# Altium footprint library RX8 GPS engine.PcbLib: 24 footprints (part 1 of 2)
Each footprint in its own frame and in the unit in brackets; x right, y up, seen from the top. Pads: shape width x height; smd on the part's side, far side on the other; paste and mask are expansions set on the pad; w line width, h text height; cw(c..) or ccw(c..) is an arc to the next point about the centre after c.
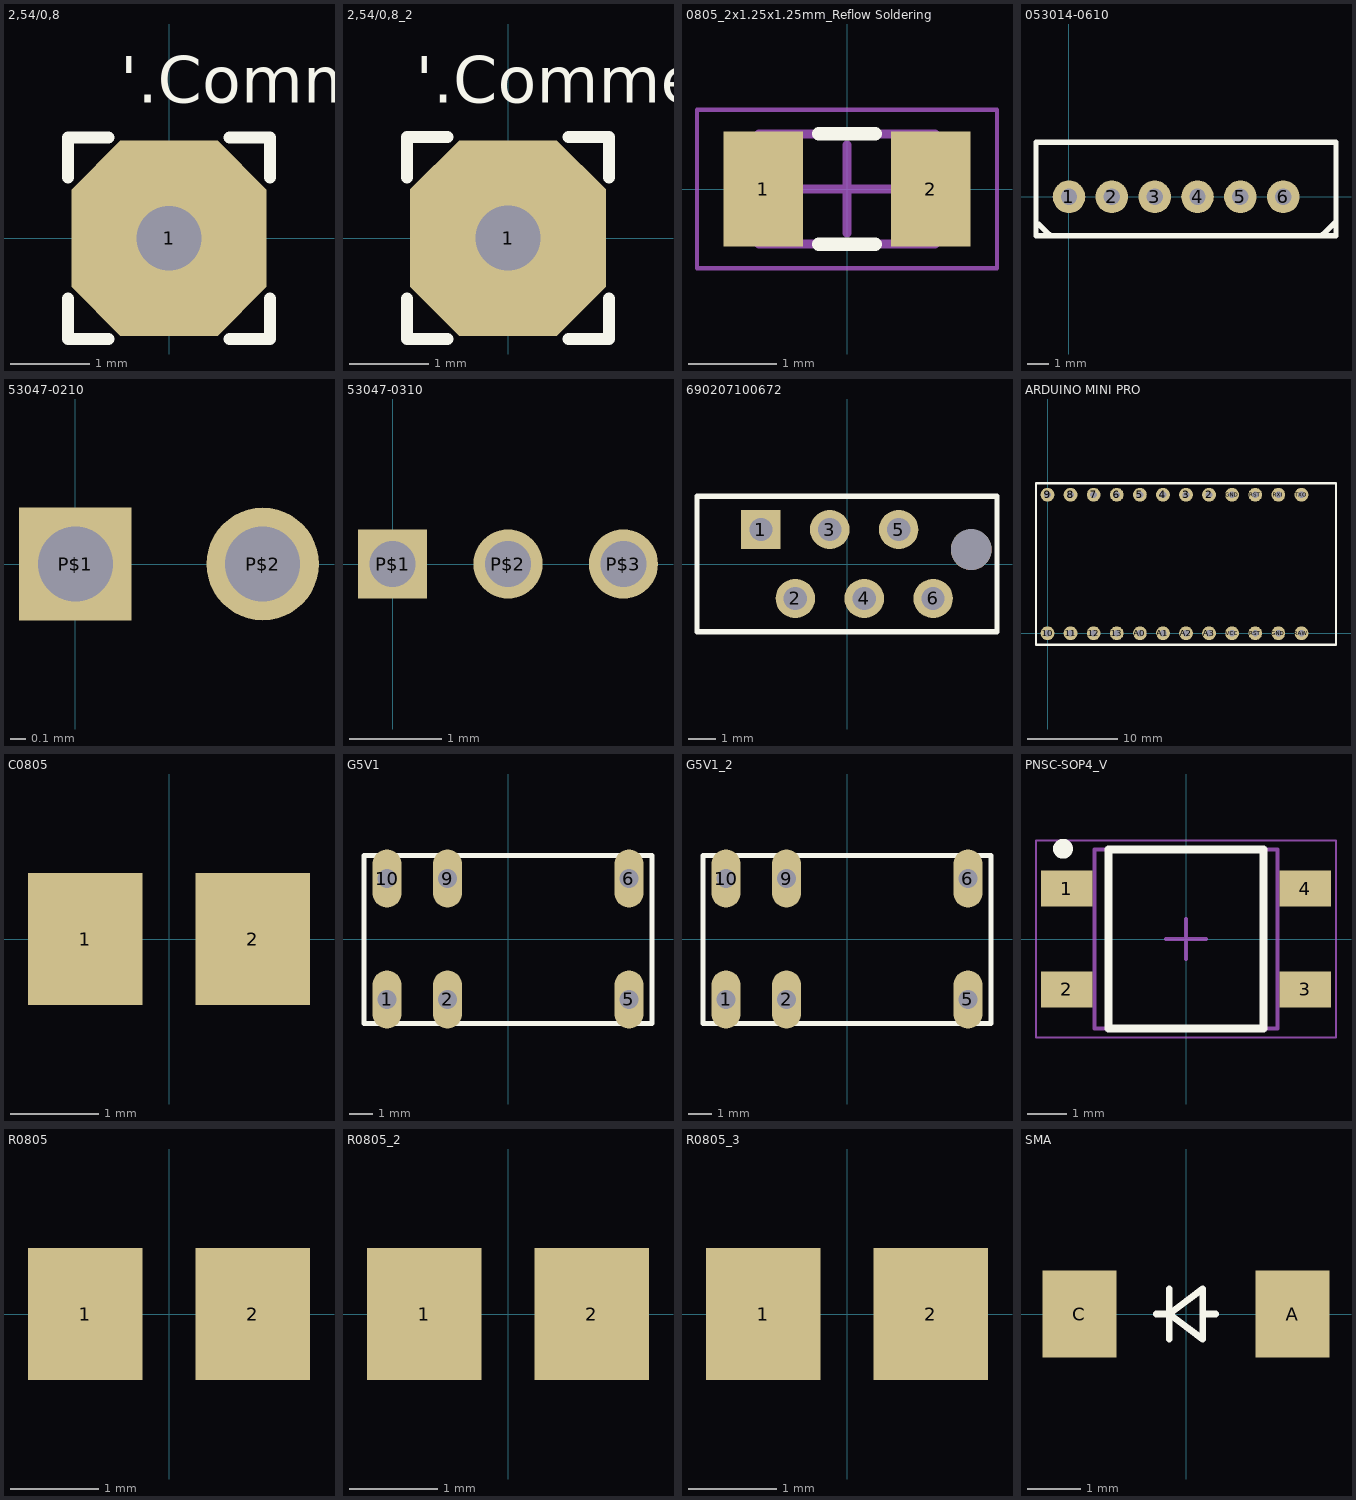
[diagram p0: the footprints below, top view; thin cyan lines are the x and y axes]

## 2,54/0,8 [mil] "2,54/0,8"
pads (1):
  oct 96.82x96.82 hole 32: 1(0,0)
Top Overlay:
  lines w6: -50,-30 -50,-50 -30,-50 ; -50,30 -50,50 -30,50 ; 30,-50 50,-50 50,-30 ; 30,50 50,50 50,30
  text "'.Comment'" at -24.2,59.42 h39.37
Mechanical 16:
  circle w6: c0,0 r25

## 2,54/0,8_2 [mil]
pads (1):
  oct 96.82x96.82 hole 32: 1(0,0)
Top Overlay:
  lines w6: -50,-30 -50,-50 -30,-50 ; -50,30 -50,50 -30,50 ; 30,-50 50,-50 50,-30 ; 30,50 50,50 50,30
  text "'.Comment'" at -45.57,59.21 h39.37
Mechanical 16:
  circle w6: c0,0 r25

## 0805_2x1.25x1.25mm_Reflow Soldering [mm] "Ceramic Capacitors, 0805, body 2x1.25mm"
height 1.25
pads (2):
  rect 0.9x1.3 smd: 1(-0.95,0) 2(0.95,0)
Top Overlay:
  lines w0.15: -0.32,-0.625 0.32,-0.625 ; -0.32,0.625 0.32,0.625
Mechanical 13:
  lines w0.1: -1,-0.625 -1,0.625 1,0.625 1,-0.625 -1,-0.625
Mechanical 15:
  lines w0.05: -1.7,-0.9 -1.7,0.9 1.7,0.9 1.7,-0.9 -1.7,-0.9
  lines w0.1: -0.5,0 0.5,0 ; 0,-0.5 0,0.5
3D body "2x1.25x1.25x0.5.stp": height 1.28, standoff 0.03, extent -1,-0.625 1,0.625

## 053014-0610 [mil]
pads (6):
  round 60 hole 30: 1(0,0) 2(78.74,0) 3(157.48,0) 4(236.22,0) 5(314.96,0) 6(393.7,0)
Top Overlay:
  lines w10: -60.59,-71.26 -60.59,100 490.59,100 490.59,-71.26 -59.33,-71.26 ; -55.59,-50 -35.59,-70 -35,-70 ; 465,-71.26 465,-70 465.59,-70 490.59,-45
3D body "Molex 2mm 6 pin - 530140610.stp": height 233.27, standoff -134.84, extent -60.59,-70 490.59,101.26

## 53047-0210 [mm] "53047-0210"
pads (2):
  rect 0.75x0.75 hole 0.5: P$1(0,0)
  round 0.75 hole 0.5: P$2(1.25,0)
3D body "530470210.stp": height 4.23, standoff -2.27, extent -1.5,-1.15 2.75,2.05
3D body: height 2.93, standoff -6.43, extent -0.889,-0.127 -0.889,-0.127

## 53047-0310 [mil] "53047-0310"
pads (3):
  rect 29.54x29.54 hole 19.69: P$1(0,0)
  round 29.54 hole 19.69: P$2(49.21,0) P$3(98.43,0)
3D body "530470310.stp": height 69.88, standoff -186.02, extent -58.27,-45.28 158.27,80.71

## 690207100672 [mm] "Transition Connector, THT, 06p"
height 5.6
pads (7):
  rect 1.45x1.45 hole 0.85: 1(-3.175,1.27)
  round 1.45 hole 0.85: 2(-1.905,-1.27) 3(-0.635,1.27) 4(0.635,-1.27) 5(1.905,1.27) 6(3.175,-1.27)
  round 1.5 hole 1.5 unplated: ""(4.575,0.53)
Top Overlay:
  lines w0.2: -5.525,-2.5 -5.525,2.5 5.525,2.5 5.525,-2.5 -5.525,-2.5
3D body "690207100672.stp": height 7.1, standoff -3.1, extent -5.525,-2.5 5.525,2.5

## ARDUINO MINI PRO [mil]
pads (24):
  round 60 hole 30: 2(700,600) 3(600,600) 4(500,600) 5(400,600) 6(300,600) 7(200,600) 8(100,600) 9(0,600) 10(0,0) 11(100,0) 12(200,0) 13(300,0) A0(400,0) A1(500,0) A2(600,0) A3(700,0) GND(800,600) GND(1000,0) RAW(1100,0) RST(900,0) RST(900,600) RXI(1000,600) TXO(1100,600) VCC(800,0)
Top Layer:
Top Overlay:
  lines w10: -50,-50 1250,-50 1250,650 -50,650 -50,-50
3D body "Arduino mini Pro.STEP": height 248.23, standoff -253.55, extent -50,-50 1250,650

## C0805 [mil] "C0805"
pads (2):
  rect 51.18x59.06 smd: 1(-37.4,0) 2(37.4,0)
3D body "805.STEP": height 17.72, standoff 0, extent -39.37,-24.6 39.37,24.61

## G5V1 [mil] "G5V1"
pads (6):
  oval 48x96 hole 32: 1(-200,-100) 2(-100,-100) 5(200,-100) 6(200,100) 9(-100,100) 10(-200,100)
Top Overlay:
  lines w8: -238.19,-139.76 -238.19,138.19 238.19,138.19 238.19,-139.76 -238.19,-139.76
3D body "Relay G5V-1.STEP": height 393.7, standoff -78.74, extent -245.52,-148.62 246.6,146.65

## G5V1_2 [mil]
pads (6):
  oval 48x96 hole 32: 1(-200,-100) 2(-100,-100) 5(200,-100) 6(200,100) 9(-100,100) 10(-200,100)
Top Overlay:
  lines w8: -238.19,-139.76 -238.19,138.19 238.19,138.19 238.19,-139.76 -238.19,-139.76
3D body "Relay G5V-1.STEP": height 393.7, standoff -78.74, extent -245.52,-148.62 246.6,146.65

## PNSC-SOP4_V [mm] "SOP, 4-Leads, Body 4.4x4.3mm, Pitch 2.54mm"
height 2.2
pads (4):
  rect 1.3x0.9 smd: 1(-3,1.27) 2(-3,-1.27) 3(3,-1.27) 4(3,1.27)
Top Overlay:
  circle w0.25: c-3.095,2.27 r0.125
  lines w0.2: -1.95,-2.25 1.95,-2.25 1.95,2.25 -1.95,2.25 -1.95,-2.25
Mechanical 13:
  lines w0.1: -2.3,-2.25 2.3,-2.25 2.3,2.25 -2.3,2.25 -2.3,-2.25
Mechanical 15:
  lines w0.05: -3.775,-2.475 -3.775,2.475 3.775,2.475 3.775,-2.475 -3.775,-2.475
  lines w0.1: -0.5,0 0.5,0 ; 0,-0.5 0,0.5
3D body "Relay static.STEP": height 1.6, standoff 0, extent -3,-1.905 3,2.035

## R0805 [mil] "R0805"
pads (2):
  rect 51.18x59.06 smd: 1(-37.4,0) 2(37.4,0)
3D body "805.STEP": height 17.72, standoff 0, extent -39.37,-25 39.37,24.21

## R0805_2 [mil]
pads (2):
  rect 51.18x59.06 smd: 1(-37.4,0) 2(37.4,0)
3D body "805.STEP": height 17.72, standoff 0, extent -39.37,-25 39.37,24.21

## R0805_3 [mil]
pads (2):
  rect 51.18x59.06 smd: 1(-37.4,0) 2(37.4,0)
3D body "805.STEP": height 17.72, standoff 0, extent -39.37,-25 39.37,24.21

## SMA [mm] "Diode"
pads (2):
  rect 1.4x1.64 smd: A(2.015,0) C(-2.015,0)
Top Overlay:
  lines w0.127: -0.561,0 -0.318,0 ; -0.318,-0.476 -0.318,0 ; -0.318,0.476 -0.318,0 ; 0.561,0 0.318,0 ; -0.318,0 0.318,0.476 0.318,0 ; -0.318,0 0.318,-0.476 0.318,0
3D body "SMA.STEP": height 1.95, standoff 0.05, extent -2.358,-1.45 2.993,1.45